# Altium footprint library SkyWar.PcbLib: 21 footprints (part 1 of 2)
Each footprint in its own frame and in the unit in brackets; x right, y up, seen from the top. Pads: shape width x height; smd on the part's side, far side on the other; paste and mask are expansions set on the pad; w line width, h text height; cw(c..) or ccw(c..) is an arc to the next point about the centre after c.
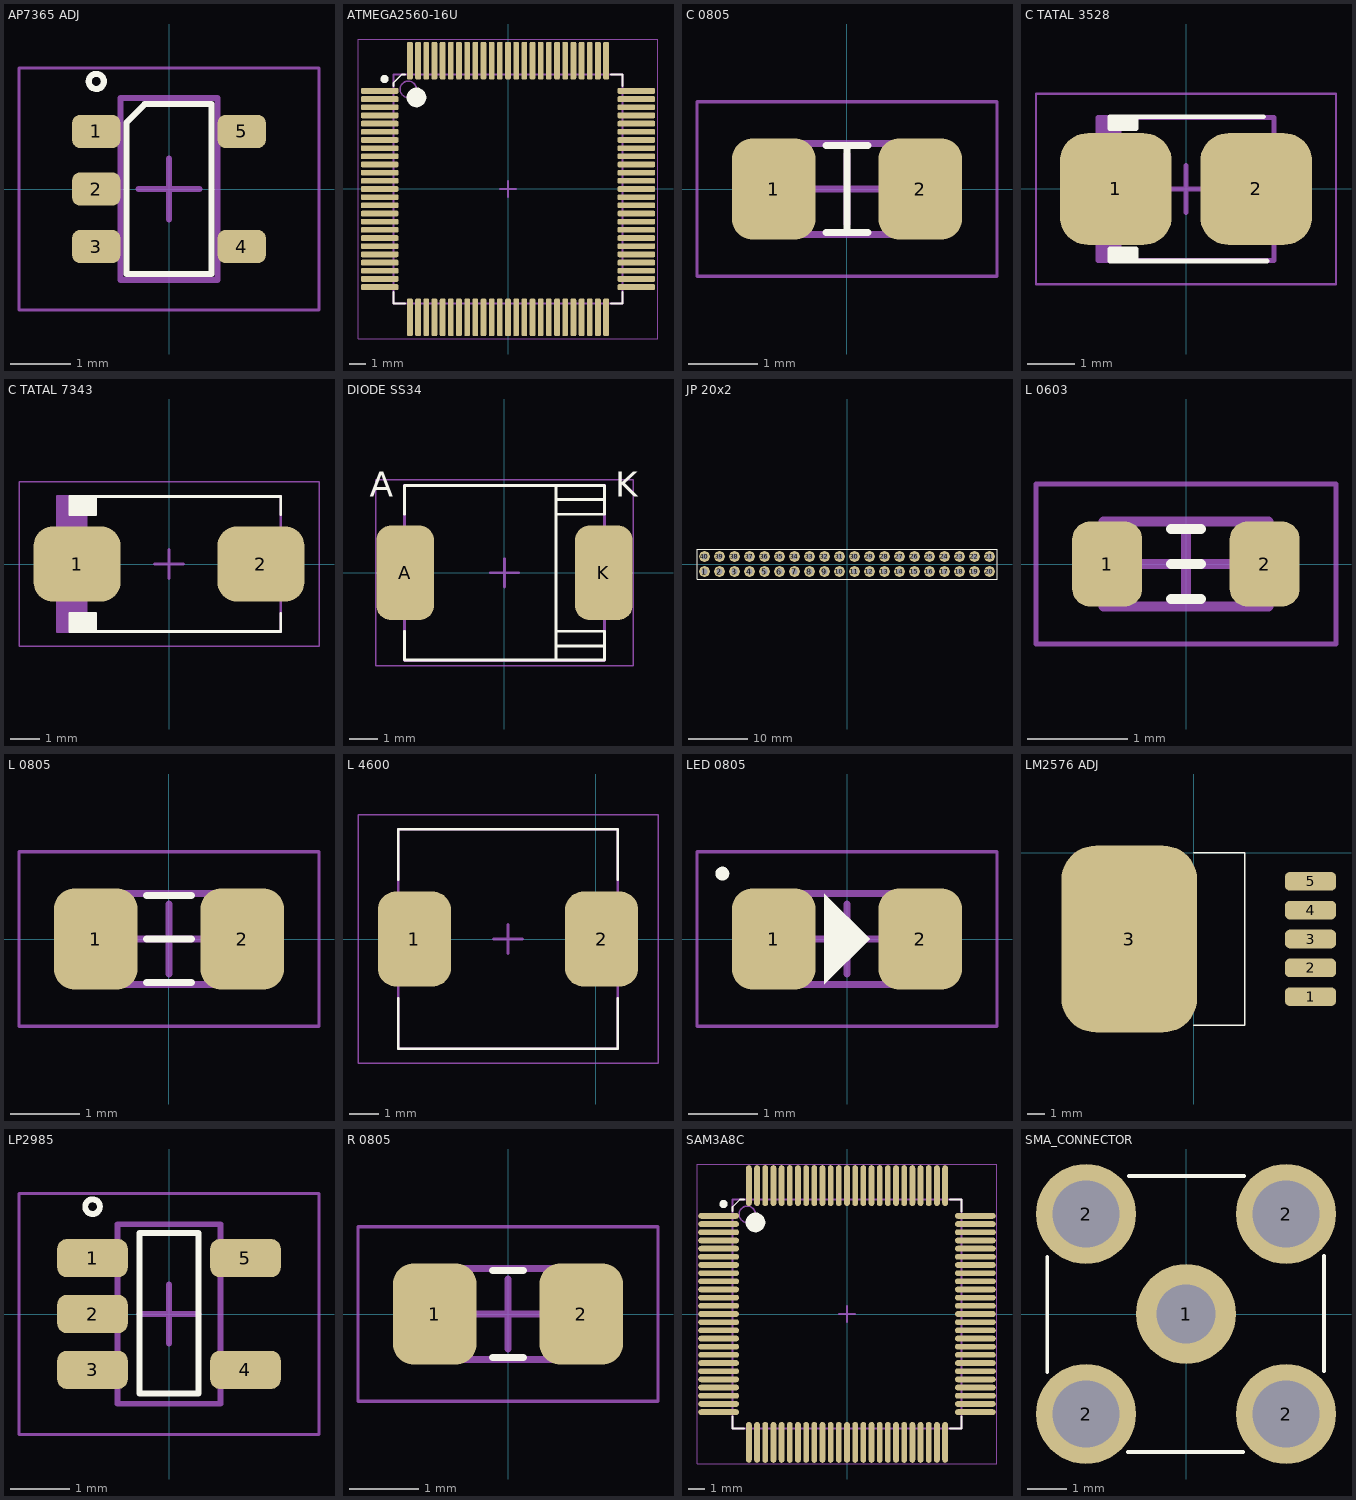
[diagram p0: the footprints below, top view; thin cyan lines are the x and y axes]

## AP7365 ADJ [mm] "SOT23, 5-Leads, Body 2.95x2.75mm, Pitch 0.95mm, IPC Low Density"
height 1.15
pads (5):
  rrect50% 0.8x0.55 smd: 1(-1.2,0.95) 2(-1.2,0) 3(-1.2,-0.95) 4(1.2,-0.95) 5(1.2,0.95)
Top Overlay:
  circle w0.1: c-1.2,1.775 r0.125
  lines w0.1: -0.7,-1.4 0.7,-1.4 0.7,1.4 -0.4,1.4 -0.7,1.1 -0.7,-1.4
Mechanical 13:
  lines w0.1: -0.8,-1.5 -0.8,1.5 0.8,1.5 0.8,-1.5 -0.8,-1.5
Mechanical 15:
  lines w0.05: -2.475,-2 -2.475,2 2.475,2 2.475,-2 -2.475,-2
  lines w0.1: -0.5,0 0.5,0 ; 0,-0.5 0,0.5
3D body "User Library-sot25.STEP": height 1.13, standoff -0.02, extent -1.2,-1.5 1.2,1.5

## ATMEGA2560-16U [mm] "TSQFP, 100-Leads, Body 14.00x14.00mm, Pitch 0.50mm, IPC Low Density"
height 1.2
pads (100):
  rrect50% 2.3x0.35 smd: 1(-7.85,6) 2(-7.85,5.5) 3(-7.85,5) 4(-7.85,4.5) 5(-7.85,4) 6(-7.85,3.5) 7(-7.85,3) 8(-7.85,2.5) 9(-7.85,2) 10(-7.85,1.5) 11(-7.85,1) 12(-7.85,0.5) 13(-7.85,0) 14(-7.85,-0.5) 15(-7.85,-1) 16(-7.85,-1.5) 17(-7.85,-2) 18(-7.85,-2.5) 19(-7.85,-3) 20(-7.85,-3.5) 21(-7.85,-4) 22(-7.85,-4.5) 23(-7.85,-5) 24(-7.85,-5.5) 25(-7.85,-6) 51(7.85,-6) 52(7.85,-5.5) 53(7.85,-5) 54(7.85,-4.5) 55(7.85,-4) 56(7.85,-3.5) 57(7.85,-3) 58(7.85,-2.5) 59(7.85,-2) 60(7.85,-1.5) 61(7.85,-1) 62(7.85,-0.5) 63(7.85,0) 64(7.85,0.5) 65(7.85,1) 66(7.85,1.5) 67(7.85,2) 68(7.85,2.5) 69(7.85,3) 70(7.85,3.5) 71(7.85,4) 72(7.85,4.5) 73(7.85,5) 74(7.85,5.5) 75(7.85,6)
  rrect50% 0.35x2.3 smd: 26(-6,-7.85) 27(-5.5,-7.85) 28(-5,-7.85) 29(-4.5,-7.85) 30(-4,-7.85) 31(-3.5,-7.85) 32(-3,-7.85) 33(-2.5,-7.85) 34(-2,-7.85) 35(-1.5,-7.85) 36(-1,-7.85) 37(-0.5,-7.85) 38(0,-7.85) 39(0.5,-7.85) 40(1,-7.85) 41(1.5,-7.85) 42(2,-7.85) 43(2.5,-7.85) 44(3,-7.85) 45(3.5,-7.85) 46(4,-7.85) 47(4.5,-7.85) 48(5,-7.85) 49(5.5,-7.85) 50(6,-7.85) 76(6,7.85) 77(5.5,7.85) 78(5,7.85) 79(4.5,7.85) 80(4,7.85) 81(3.5,7.85) 82(3,7.85) 83(2.5,7.85) 84(2,7.85) 85(1.5,7.85) 86(1,7.85) 87(0.5,7.85) 88(0,7.85) 89(-0.5,7.85) 90(-1,7.85) 91(-1.5,7.85) 92(-2,7.85) 93(-2.5,7.85) 94(-3,7.85) 95(-3.5,7.85) 96(-4,7.85) 97(-4.5,7.85) 98(-5,7.85) 99(-5.5,7.85) 100(-6,7.85)
Top Overlay:
  circle w0.6: c-5.6,5.6 r0.3
  circle w0.25: c-7.55,6.725 r0.125
  lines w0.1: -7,-6.3 -7,-7 -6.3,-7 ; -7,6.3 -7,6.5 -6.5,7 -6.3,7 ; 6.3,-7 7,-7 7,-6.3 ; 6.3,7 7,7 7,6.3
Mechanical 13:
  circle w0.1: c-6.1,6.1 r0.5
  lines w0.1: -7,-7 7,-7 7,7 -7,7 -7,-7
Mechanical 15:
  lines w0.05: -9.175,-9.175 9.175,-9.175 9.175,9.175 -9.175,9.175 -9.175,-9.175
  lines w0.1: -0.5,0 0.5,0 ; 0,-0.5 0,0.5
3D body "User Library-TQFP100_Grid_0_5.STEP": height 1.2, standoff 0, extent -8,-8 8,8

## C 0805 [mm] "Chip Capacitor, 2-Leads, Body 2.00x1.20mm, IPC Low Density"
height 0.5
pads (2):
  rrect50% 1.2x1.45 smd: 1(-1.05,0) 2(1.05,0)
Top Overlay:
  lines w0.1: -0.3,-0.625 0.3,-0.625 ; -0.3,0.625 0.3,0.625 ; 0,-0.625 0,0.625
Mechanical 13:
  lines w0.1: -1.05,-0.65 -1.05,0.65 1.05,0.65 1.05,-0.65 -1.05,-0.65
Mechanical 15:
  lines w0.05: -2.15,-1.25 -2.15,1.25 2.15,1.25 2.15,-1.25 -2.15,-1.25
  lines w0.1: -0.5,0 0.5,0 ; 0,-0.5 0,0.5
3D body "70095605.stp": height 0.89, standoff 0.01, extent -1.025,-0.725 1.175,0.725

## C TATAL 3528 [mm] "Molded Capacitor, 2-Leads, Body 3.50x2.80mm, IPC Low Density"
height 2.1
pads (2):
  rrect50% 2.35x2.35 smd: 1(-1.475,0) 2(1.475,0)
Top Overlay:
  region: -1.6,1.265 -1.6,1.515 -1.05,1.515 -1.05,1.265
  region: -1.6,-1.51 -1.05,-1.51 -1.05,-1.26 -1.6,-1.26
  lines w0.1: 1.625,1.515 -1.05,1.515 ; 1.7,-1.51 -1.05,-1.51 ; -1.05,-1.51 -1.6,-1.51 -1.6,-1.26 -1.05,-1.26 -1.05,-1.51 ; -1.05,1.515 -1.6,1.515 -1.6,1.265 -1.05,1.265 -1.05,1.515
Mechanical 13:
  rectangle: -1.85,-1.5 -1.352,1.5
  lines w0.1: -1.85,-1.5 1.85,-1.5 1.85,1.5 -1.85,1.5 -1.85,-1.5
Mechanical 15:
  lines w0.05: -3.15,-2 3.15,-2 3.15,2 -3.15,2 -3.15,-2
  lines w0.1: -0.5,0 0.5,0 ; 0,-0.5 0,0.5
3D body "User Library-AVX_BCASE.STEP": height 2.03, standoff 0, extent -1.75,-1.51 1.95,1.42

## C TATAL 7343 [mm] "Molded Capacitor, 2-Leads, Body 7.30x4.30mm, IPC Low Density"
height 3.1
pads (2):
  rrect50% 2.95x2.55 smd: 1(-3.125,0) 2(3.125,0)
Top Overlay:
  region: -3.375,-2.3 -3.375,-1.675 -2.5,-1.675 -2.5,-2.3
  region: -3.375,1.675 -2.5,1.675 -2.5,2.3 -3.375,2.3
  lines w0.1: 3.8,-1.675 3.8,-2.3 -2.5,-2.3 ; 3.8,1.675 3.8,2.3 -2.5,2.3 ; -2.5,-2.3 -3.375,-2.3 -3.375,-1.675 -2.5,-1.675 -2.5,-2.3 ; -2.5,2.3 -3.375,2.3 -3.375,1.675 -2.5,1.675 -2.5,2.3
Mechanical 13:
  rectangle: -3.8,-2.3 -2.778,2.3
  lines w0.1: -3.8,-2.3 3.8,-2.3 3.8,2.3 -3.8,2.3 -3.8,-2.3
Mechanical 15:
  lines w0.05: -5.1,-2.8 5.1,-2.8 5.1,2.8 -5.1,2.8 -5.1,-2.8
  lines w0.1: -0.5,0 0.5,0 ; 0,-0.5 0,0.5
3D body "User Library-AVX_D_CASE.STEP": height 3.01, standoff 0, extent -3.575,-2.25 3.825,2.2

## DIODE SS34 [mm] "SODFL, 2-Leads, Body 5.90x7.94mm, IPC Low Density"
height 2.62
pads (2):
  rrect50% 2.05x3.35 smd: A(-3.525,0) K(3.525,0)
Top Overlay:
  lines w0.1: -3.55,-2.075 -3.55,-3.1 3.55,-3.1 3.55,-2.075 1.85,-2.075 ; -3.55,2.075 -3.55,3.1 3.55,3.1 3.55,2.075 1.85,2.075 ; 1.825,-3.1 1.825,3.1 ; 1.825,-2.6 3.55,-2.6 ; 1.825,2.6 3.55,2.6
  text "A" at -4.775,2.4 h1.52
  text "K" at 3.925,2.4 h1.52
Mechanical 13:
  lines w0.1: -3.555,-3.11 3.555,-3.11 3.555,3.11 -3.555,3.11 -3.555,-3.11
Mechanical 15:
  lines w0.05: -4.575,-3.3 4.575,-3.3 4.575,3.3 -4.575,3.3 -4.575,-3.3
  lines w0.1: -0.5,0 0.5,0 ; 0,-0.5 0,0.5
3D body "User Library-DIOM8261X24.STEP": height 2.4, standoff 0.03, extent -4.04,-3 4.09,3.1

## JP 20x2 [mm]
pads (40):
  round 1.8 hole 1.1: 1(-24.13,-1.27) 2(-21.59,-1.27) 3(-19.05,-1.27) 4(-16.51,-1.27) 5(-13.97,-1.27) 6(-11.43,-1.27) 7(-8.89,-1.27) 8(-6.35,-1.27) 9(-3.81,-1.27) 10(-1.27,-1.27) 11(1.27,-1.27) 12(3.81,-1.27) 13(6.35,-1.27) 14(8.89,-1.27) 15(11.43,-1.27) 16(13.97,-1.27) 17(16.51,-1.27) 18(19.05,-1.27) 19(21.59,-1.27) 20(24.13,-1.27) 21(24.13,1.27) 22(21.59,1.27) 23(19.05,1.27) 24(16.51,1.27) 25(13.97,1.27) 26(11.43,1.27) 27(8.89,1.27) 28(6.35,1.27) 29(3.81,1.27) 30(1.27,1.27) 31(-1.27,1.27) 32(-3.81,1.27) 33(-6.35,1.27) 34(-8.89,1.27) 35(-11.43,1.27) 36(-13.97,1.27) 37(-16.51,1.27) 38(-19.05,1.27) 39(-21.59,1.27) 40(-24.13,1.27)
Top Overlay:
  lines w0.1: -25.4,-2.54 25.4,-2.54 25.4,2.54 -25.4,2.54 -25.4,-2.54
3D body "User Library-2x4 female header 2_54mm pitch.STEP": height 4.5, standoff -3.15, extent -25.4,-2.54 -15.24,2.54
3D body "User Library-2x4 female header 2_54mm pitch.STEP": height 4.5, standoff -3.15, extent -15.24,-2.54 -5.08,2.54
3D body "User Library-2x4 female header 2_54mm pitch.STEP": height 4.5, standoff -3.15, extent -5.08,-2.54 5.08,2.54
3D body "User Library-2x4 female header 2_54mm pitch.STEP": height 4.5, standoff -3.15, extent 5.08,-2.54 15.24,2.54
3D body "User Library-2x4 female header 2_54mm pitch.STEP": height 4.5, standoff -3.15, extent 15.24,-2.54 25.4,2.54

## L 0603 [mm] "Chip Inductor, 2-Leads, Body 1.60x0.80mm, IPC Low Density"
height 0.5
pads (2):
  rrect50% 0.7x0.85 smd: 1(-0.788,0) 2(0.787,0)
Top Overlay:
  lines w0.1: -0.15,-0.35 0.15,-0.35 ; -0.15,0 0.15,0 ; -0.15,0.35 0.15,0.35
Mechanical 13:
  lines w0.1: -0.825,-0.425 -0.825,0.425 0.825,0.425 0.825,-0.425 -0.825,-0.425
Mechanical 15:
  lines w0.05: -1.5,-0.8 -1.5,0.8 1.5,0.8 1.5,-0.8 -1.5,-0.8
  lines w0.1: -0.425,0 0.425,0 ; 0,-0.425 0,0.425
3D body "rmc1_16k912ftp.stp": height 0.45, standoff 0, extent -0.8,-0.4 0.8,0.4

## L 0805 [mm] "Chip Inductor, 2-Leads, Body 2.00x1.20mm, IPC Low Density"
height 0.5
pads (2):
  rrect50% 1.2x1.45 smd: 1(-1.05,0) 2(1.05,0)
Top Overlay:
  lines w0.1: -0.325,-0.625 0.325,-0.625 ; -0.325,0 0.325,0 ; -0.325,0.625 0.325,0.625
Mechanical 13:
  lines w0.1: -1.05,-0.65 1.05,-0.65 1.05,0.65 -1.05,0.65 -1.05,-0.65
Mechanical 15:
  lines w0.05: -2.15,-1.25 2.15,-1.25 2.15,1.25 -2.15,1.25 -2.15,-1.25
  lines w0.1: -0.5,0 0.5,0 ; 0,-0.5 0,0.5
3D body "45634.stp": height 0.52, standoff 0.02, extent -1,-0.625 1,0.625

## L 4600 [mm] "Precision Wire Wound Inductor, 2-Leads, Body 7.30x7.30mm, IPC Low Density"
height 4.55
pads (2):
  rrect50% 2.5x3.25 smd: 1(-6.2,0) 2(0.2,0)
Top Overlay:
  lines w0.1: -6.75,-2.025 -6.75,-3.75 0.75,-3.75 0.75,-2.025 ; -6.75,2.025 -6.75,3.75 0.75,3.75 0.75,2.025
Mechanical 13:
  lines w0.1: -6.75,-3.75 -6.75,3.75 0.75,3.75 0.75,-3.75 -6.75,-3.75
Mechanical 15:
  lines w0.05: -8.125,-4.25 -8.125,4.25 2.125,4.25 2.125,-4.25 -8.125,-4.25
  lines w0.1: -3.5,0 -2.5,0 ; -3,-0.5 -3,0.5
3D body "SW3dPS-Murata_4600.STEP": height 4.55, standoff 0, extent -6.714,-3.625 0.714,3.675

## LED 0805 [mm] "Chip Diode, 2-Leads, Body 2.00x1.20mm, IPC Low Density"
height 0.5
pads (2):
  rrect50% 1.2x1.45 smd: 1(-1.05,0) 2(1.05,0)
Top Overlay:
  circle w0.1: c-1.787,0.937 r0.05
  region: -0.325,-0.65 -0.325,0.65 0.325,0
Mechanical 13:
  lines w0.1: -1.05,-0.65 -1.05,0.65 1.05,0.65 1.05,-0.65 -1.05,-0.65
Mechanical 15:
  lines w0.05: -2.15,-1.25 -2.15,1.25 2.15,1.25 2.15,-1.25 -2.15,-1.25
  lines w0.1: -0.5,0 0.5,0 ; 0,-0.5 0,0.5
3D body "User Library-led_0805LED0805_red.STEP": height 1.12, standoff 0.02, extent -1.01,-0.625 1.01,0.625

## LM2576 ADJ [mm]
pads (6):
  rrect50% 3x1.1 smd: 1(6.875,-8.475) 2(6.875,-6.775) 3(6.875,-5.075) 4(6.875,-3.375) 5(6.875,-1.675)
  rrect50% 8x11 smd: 3(-3.8,-5.075)
Top Overlay:
  lines w0.1: 0,-10.15 3,-10.15 3,0 0,0
3D body "User Library-TO-263-5.STEP": height 4.66, standoff 0.1, extent -6.587,-10.155 7.428,0.005

## LP2985 [mm] "SOT23, 5-Leads, Body 2.90x2.80mm, Pitch 0.95mm, IPC Low Density"
height 1.45
pads (5):
  rrect50% 1.2x0.65 smd: 1(-1.3,0.95) 2(-1.3,0) 3(-1.3,-0.95) 4(1.3,-0.95) 5(1.3,0.95)
Top Overlay:
  circle w0.1: c-1.3,1.825 r0.125
  lines w0.1: -0.5,-1.35 0.5,-1.35 0.5,1.375 -0.5,1.375 -0.5,-1.35
Mechanical 13:
  lines w0.1: -0.875,-1.525 -0.875,1.525 0.875,1.525 0.875,-1.525 -0.875,-1.525
Mechanical 15:
  lines w0.05: -2.55,-2.05 -2.55,2.05 2.55,2.05 2.55,-2.05 -2.55,-2.05
  lines w0.1: -0.5,0 0.5,0 ; 0,-0.5 0,0.5
3D body "User Library-SOT23-5-2.STEP": height 1.45, standoff 0, extent -1.4,-1.475 1.4,1.425

## R 0805 [mm] "Chip Capacitor, 2-Leads, Body 2.00x1.20mm, IPC Low Density"
height 0.5
pads (2):
  rrect50% 1.2x1.45 smd: 1(-1.05,0) 2(1.05,0)
Top Overlay:
  lines w0.1: -0.225,-0.625 0.225,-0.625 ; -0.225,0.625 0.225,0.625
Mechanical 13:
  lines w0.1: -1.05,-0.65 -1.05,0.65 1.05,0.65 1.05,-0.65 -1.05,-0.65
Mechanical 15:
  lines w0.05: -2.15,-1.25 -2.15,1.25 2.15,1.25 2.15,-1.25 -2.15,-1.25
  lines w0.1: -0.5,0 0.5,0 ; 0,-0.5 0,0.5
3D body "User Library-R-0805-1.STEP": height 0.76, standoff 0, extent -1.15,-0.675 1.15,0.675

## SAM3A8C [mm] "TSQFP, 100-Leads, Body 14.00x14.00mm, Pitch 0.50mm, IPC Low Density"
height 1.6
pads (100):
  oval 2.5x0.35 smd: 1(-7.85,6) 2(-7.85,5.5) 3(-7.85,5) 4(-7.85,4.5) 5(-7.85,4) 6(-7.85,3.5) 7(-7.85,3) 8(-7.85,2.5) 9(-7.85,2) 10(-7.85,1.5) 11(-7.85,1) 12(-7.85,0.5) 13(-7.85,0) 14(-7.85,-0.5) 15(-7.85,-1) 16(-7.85,-1.5) 17(-7.85,-2) 18(-7.85,-2.5) 19(-7.85,-3) 20(-7.85,-3.5) 21(-7.85,-4) 22(-7.85,-4.5) 23(-7.85,-5) 24(-7.85,-5.5) 25(-7.85,-6) 51(7.85,-6) 52(7.85,-5.5) 53(7.85,-5) 54(7.85,-4.5) 55(7.85,-4) 56(7.85,-3.5) 57(7.85,-3) 58(7.85,-2.5) 59(7.85,-2) 60(7.85,-1.5) 61(7.85,-1) 62(7.85,-0.5) 63(7.85,0) 64(7.85,0.5) 65(7.85,1) 66(7.85,1.5) 67(7.85,2) 68(7.85,2.5) 69(7.85,3) 70(7.85,3.5) 71(7.85,4) 72(7.85,4.5) 73(7.85,5) 74(7.85,5.5) 75(7.85,6)
  oval 0.35x2.5 smd: 26(-6,-7.85) 27(-5.5,-7.85) 28(-5,-7.85) 29(-4.5,-7.85) 30(-4,-7.85) 31(-3.5,-7.85) 32(-3,-7.85) 33(-2.5,-7.85) 34(-2,-7.85) 35(-1.5,-7.85) 36(-1,-7.85) 37(-0.5,-7.85) 38(0,-7.85) 39(0.5,-7.85) 40(1,-7.85) 41(1.5,-7.85) 42(2,-7.85) 43(2.5,-7.85) 44(3,-7.85) 45(3.5,-7.85) 46(4,-7.85) 47(4.5,-7.85) 48(5,-7.85) 49(5.5,-7.85) 50(6,-7.85) 76(6,7.85) 77(5.5,7.85) 78(5,7.85) 79(4.5,7.85) 80(4,7.85) 81(3.5,7.85) 82(3,7.85) 83(2.5,7.85) 84(2,7.85) 85(1.5,7.85) 86(1,7.85) 87(0.5,7.85) 88(0,7.85) 89(-0.5,7.85) 90(-1,7.85) 91(-1.5,7.85) 92(-2,7.85) 93(-2.5,7.85) 94(-3,7.85) 95(-3.5,7.85) 96(-4,7.85) 97(-4.5,7.85) 98(-5,7.85) 99(-5.5,7.85) 100(-6,7.85)
Top Overlay:
  circle w0.6: c-5.6,5.6 r0.3
  circle w0.25: c-7.55,6.725 r0.125
  lines w0.1: -7,-6.25 -7,-7 -6.275,-7 ; -7,6.3 -7,6.55 -6.55,7 -6.3,7 ; 6.275,-7 7,-7 7,-6.25 ; 6.275,7 7,7 7,6.25
Mechanical 13:
  circle w0.1: c-6.1,6.1 r0.5
  lines w0.1: -7,-7 7,-7 7,7 -7,7 -7,-7
Mechanical 15:
  lines w0.05: -9.175,-9.175 9.175,-9.175 9.175,9.175 -9.175,9.175 -9.175,-9.175
  lines w0.1: -0.5,0 0.5,0 ; 0,-0.5 0,0.5
3D body "User Library-LQFP100-2.STEP": height 1.6, standoff 0, extent -8.015,-8.025 8,7.99

## SMA_CONNECTOR [mm]
pads (5):
  round 2.54 hole 1.5: 1(0,0)
  round 2.54 hole 1.7: 2(-2.54,-2.54) 2(-2.54,2.54) 2(2.54,-2.54) 2(2.54,2.54)
Top Overlay:
  lines w0.1: -3.525,-1.475 -3.525,1.45 ; -1.475,-3.5 1.45,-3.5 ; -1.45,3.5 1.475,3.5 ; 3.5,-1.45 3.5,1.475
3D body "User Library-901-143-6RFX.STEP": height 9.86, standoff -3.94, extent -3.5,-3.5 11.6,3.5